# Altium footprint library zynq.PcbLib: 111 footprints (part 4 of 7)
Each footprint in its own frame and in the unit in brackets; x right, y up, seen from the top. Pads: shape width x height; smd on the part's side, far side on the other; paste and mask are expansions set on the pad; w line width, h text height; cw(c..) or ccw(c..) is an arc to the next point about the centre after c.
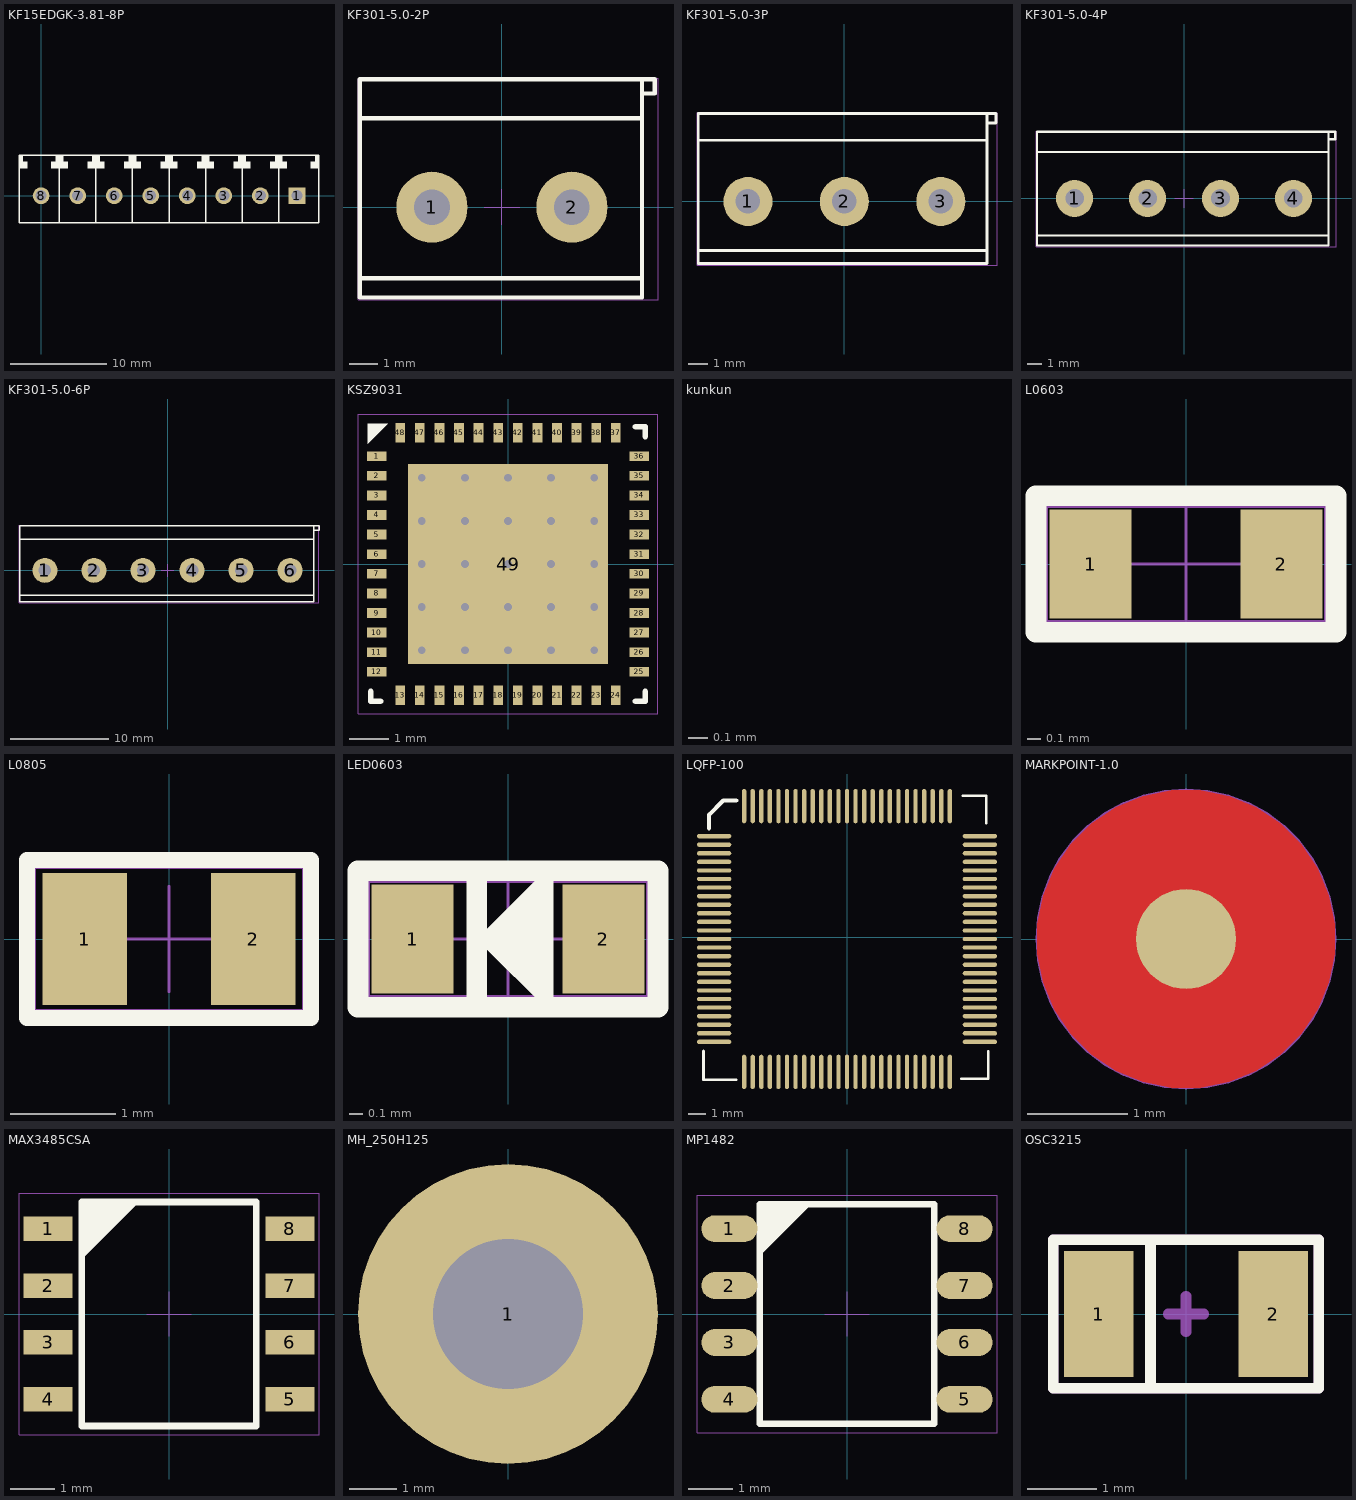
[diagram p3: the footprints below, top view; thin cyan lines are the x and y axes]

## KF15EDGK-3.81-8P [mm]
pads (8):
  rect 1.75x1.75 hole 1.15: 1(26.67,0)
  round 1.75 hole 1.15: 2(22.86,0) 3(19.05,0) 4(15.24,0) 5(11.43,0) 6(7.62,0) 7(3.81,0) 8(0,0)
Top Overlay:
  region: 28.975,4.201 28.975,2.845 28.121,2.845 28.121,3.551 28.596,3.551 28.596,4.201
  region: -2.305,4.201 -2.305,2.845 -1.451,2.845 -1.451,3.551 -1.926,3.551 -1.926,4.201
  region: 24.388,4.201 24.388,3.551 23.917,3.551 23.917,2.845 25.621,2.845 25.621,3.551 25.146,3.551 25.146,4.201
  region: 20.578,4.201 20.578,3.551 20.107,3.551 20.107,2.845 21.811,2.845 21.811,3.551 21.336,3.551 21.336,4.201
  region: 16.768,4.201 16.768,3.551 16.297,3.551 16.297,2.845 18.001,2.845 18.001,3.551 17.526,3.551 17.526,4.201
  region: 12.958,4.201 12.958,3.551 12.487,3.551 12.487,2.845 14.191,2.845 14.191,3.551 13.716,3.551 13.716,4.201
  region: 9.148,4.201 9.148,3.551 8.677,3.551 8.677,2.845 10.381,2.845 10.381,3.551 9.906,3.551 9.906,4.201
  region: 5.338,4.201 5.338,3.551 4.867,3.551 4.867,2.845 6.571,2.845 6.571,3.551 6.096,3.551 6.096,4.201
  region: 1.528,4.201 1.528,3.551 1.057,3.551 1.057,2.845 2.761,2.845 2.761,3.551 2.286,3.551 2.286,4.201
  lines w0.152: 1.907,-2.774 1.907,4.2 ; 5.717,-2.774 5.717,4.2 ; 9.527,-2.774 9.527,4.2 ; 13.337,-2.774 13.337,4.2 ; 17.147,-2.774 17.147,4.2 ; 20.957,-2.774 20.957,4.2 ; 24.767,-2.774 24.767,4.2 ; -2.305,-2.8 28.975,-2.8 28.975,4.2 -2.305,4.2 -2.305,-2.8

## KF301-5.0-2P [mm] "5.0间距螺钉端子"
pads (2):
  round 2.54 hole 1.27: 1(-2.5,0) 2(2.5,0)
Top Overlay:
  lines w0.152: -5.08,-2.54 5,-2.54 ; -5.08,3.175 4.953,3.175 ; 5,4.064 5.461,4.064 5.461,4.572 5,4.572 ; 5,4.572 -5.08,4.572 -5.08,-3.225 5,-3.225 5,4.572
Mechanical 15:
  lines w0.025: -0.635,0 0.635,0 ; 0,-0.635 0,0.635 ; -5.143,-3.315 -5.143,4.61 5.575,4.61 5.575,-3.315 -5.143,-3.315
3D body "KF301-5.0-2.STEP": height 10.16, standoff -1.84, extent -5.033,-3.186 5.467,4.514

## KF301-5.0-3P [mm]
pads (3):
  round 2.54 hole 1.27: 1(-5,0) 2(0,0) 3(5,0)
Top Overlay:
  lines w0.152: -7.58,-2.54 7.406,-2.54 ; -7.58,3.175 7.406,3.175 ; 7.406,4.064 7.867,4.064 7.867,4.572 7.406,4.572 ; 7.406,4.572 7.406,-3.225 -7.58,-3.225 -7.58,4.572 7.406,4.572
Mechanical 15:
  lines w0.025: -0.635,0 0.635,0 ; 0,-0.635 0,0.635 ; -7.644,-3.315 7.914,-3.315 7.914,4.61 -7.644,4.61 -7.644,-3.315
3D body "KF301-5.0-3.STEP": height 10, standoff -2, extent -7.583,-3.128 7.917,4.572

## KF301-5.0-4P [mm]
pads (4):
  round 2.54 hole 1.27: 1(-7.5,0) 2(-2.5,0) 3(2.5,0) 4(7.5,0)
Top Overlay:
  lines w0.152: -10.08,-2.54 9.906,-2.54 ; -10.08,3.175 9.906,3.175 ; 9.906,4.064 10.367,4.064 10.367,4.572 9.906,4.572 ; 9.906,4.572 9.906,-3.225 -10.08,-3.225 -10.08,4.572 9.906,4.572
Mechanical 15:
  lines w0.025: -0.635,0 0.635,0 ; 0,-0.635 0,0.635 ; -10.144,-3.315 10.414,-3.315 10.414,4.61 -10.144,4.61 -10.144,-3.315

## KF301-5.0-6P [mm]
pads (6):
  round 2.54 hole 1.27: 1(-12.5,0) 2(-7.5,0) 3(-2.5,0) 4(2.5,0) 5(7.5,0) 6(12.5,0)
Top Overlay:
  lines w0.152: -15.08,-2.54 14.812,-2.54 ; -15.08,3.175 14.906,3.175 ; 14.906,4.064 15.447,4.064 15.447,4.572 4.906,4.572 -15.08,4.572 -15.08,-3.225 14.906,-3.225 14.906,4.572
Mechanical 15:
  lines w0.025: -0.635,0 0.635,0 ; 0,-0.635 0,0.635 ; -15.144,-3.315 15.414,-3.315 15.414,4.61 -15.144,4.61 -15.144,-3.315

## KSZ9031 [mm] "QFN, 48-Leads, Body 7.00x7.00mm, Pitch 0.50mm, Thermal Pad 5.10x5.10mm, IPC High Density"
height 0.85
pads (49):
  rect 0.5x0.25 smd: 1(-3.35,2.75) 2(-3.35,2.25) 3(-3.35,1.75) 4(-3.35,1.25) 5(-3.35,0.75) 6(-3.35,0.25) 7(-3.35,-0.25) 8(-3.35,-0.75) 9(-3.35,-1.25) 10(-3.35,-1.75) 11(-3.35,-2.25) 12(-3.35,-2.75) 25(3.35,-2.75) 26(3.35,-2.25) 27(3.35,-1.75) 28(3.35,-1.25) 29(3.35,-0.75) 30(3.35,-0.25) 31(3.35,0.25) 32(3.35,0.75) 33(3.35,1.25) 34(3.35,1.75) 35(3.35,2.25) 36(3.35,2.75)
  rect 0.25x0.5 smd: 13(-2.75,-3.35) 14(-2.25,-3.35) 15(-1.75,-3.35) 16(-1.25,-3.35) 17(-0.75,-3.35) 18(-0.25,-3.35) 19(0.25,-3.35) 20(0.75,-3.35) 21(1.25,-3.35) 22(1.75,-3.35) 23(2.25,-3.35) 24(2.75,-3.35) 37(2.75,3.35) 38(2.25,3.35) 39(1.75,3.35) 40(1.25,3.35) 41(0.75,3.35) 42(0.25,3.35) 43(-0.25,3.35) 44(-0.75,3.35) 45(-1.25,3.35) 46(-1.75,3.35) 47(-2.25,3.35) 48(-2.75,3.35)
  rect 5.1x5.1 smd: 49(0,0)
via -2.2,2.2 diameter 0.45 hole 0.2
via -1.1,2.2 diameter 0.45 hole 0.2
via 0,2.2 diameter 0.45 hole 0.2
via 1.1,2.2 diameter 0.45 hole 0.2
via 2.2,2.2 diameter 0.45 hole 0.2
via -2.2,1.1 diameter 0.45 hole 0.2
via -1.1,1.1 diameter 0.45 hole 0.2
via 0,1.1 diameter 0.45 hole 0.2
via 1.1,1.1 diameter 0.45 hole 0.2
via 2.2,1.1 diameter 0.45 hole 0.2
via -2.2,0 diameter 0.45 hole 0.2
via -1.1,0 diameter 0.45 hole 0.2
via 0,0 diameter 0.45 hole 0.2
via 1.1,0 diameter 0.45 hole 0.2
via 2.2,0 diameter 0.45 hole 0.2
via -2.2,-1.1 diameter 0.45 hole 0.2
via -1.1,-1.1 diameter 0.45 hole 0.2
via 0,-1.1 diameter 0.45 hole 0.2
via 1.1,-1.1 diameter 0.45 hole 0.2
via 2.2,-1.1 diameter 0.45 hole 0.2
via -2.2,-2.2 diameter 0.45 hole 0.2
via -1.1,-2.2 diameter 0.45 hole 0.2
via 0,-2.2 diameter 0.45 hole 0.2
via 1.1,-2.2 diameter 0.45 hole 0.2
via 2.2,-2.2 diameter 0.45 hole 0.2
Top Overlay:
  region: -3.062,3.577 -3.577,3.577 -3.577,3.063
  lines w0.152: -3.5,-3.251 -3.5,-3.5 -3.251,-3.5 ; 3.251,-3.5 3.5,-3.5 3.5,-3.251 ; 3.251,3.5 3.5,3.5 3.5,3.251
Mechanical 15:
  lines w0.025: -0.5,0 0.5,0 ; 0,-0.5 0,0.5 ; -3.825,-3.825 -3.825,3.825 3.825,3.825 3.825,-3.825 -3.825,-3.825
3D body "ksz9031.STEP": height 0.88, standoff 0, extent -3.567,-3.57 3.563,3.56

## kunkun [mm]
Top Overlay:
  text "Designed by RUAN DING" at -6.858,0.286 h1.52

## L0603 [mm]
pads (2):
  rect 0.6x0.8 smd: 1(-0.7,0) 2(0.7,0)
Top Overlay:
  lines w0.152: -1.1,-0.5 -1.1,0.5 1.1,0.5 1.1,-0.5 -1.1,-0.5
Mechanical 15:
  lines w0.025: -0.45,0 0.45,0 ; 0,-0.45 0,0.45 ; -1.024,-0.424 -1.024,0.424 1.024,0.424 1.024,-0.424 -1.024,-0.424
3D body "0603-thick5.STEP": height 0.5, standoff 0, extent -0.81,-0.404 0.79,0.405

## L0805 [mm] "C0805"
pads (2):
  rect 0.8x1.25 smd: 1(-0.8,0) 2(0.8,0)
Top Overlay:
  lines w0.152: -1.35,-0.75 -1.35,0.75 1.35,0.75 1.35,-0.75 -1.35,-0.75
Mechanical 15:
  lines w0.025: -0.5,0 0.5,0 ; 0,-0.5 0,0.5 ; -1.275,-0.676 -1.275,0.676 1.275,0.676 1.275,-0.676 -1.275,-0.676
3D body "0805-thickM.STEP": height 1.19, standoff 0, extent -0.989,-0.66 1.011,0.665

## LED0603 [mm] "Chip LED, 2-Leads, Body 1.60x0.80mm, IPC High Density"
height 0.45
pads (2):
  rect 0.6x0.8 smd: 1(-0.7,0) 2(0.7,0)
Top Overlay:
  region: 0.33,0.559 -0.229,0 0.33,-0.559
  lines w0.152: -0.229,-0.5 -0.229,0.5 ; -1.1,-0.5 -1.1,0.5 1.1,0.5 1.1,-0.5 -1.1,-0.5
Mechanical 15:
  lines w0.025: -0.45,0 0.45,0 ; 0,-0.45 0,0.45 ; -1.024,-0.424 1.024,-0.424 1.024,0.424 -1.024,0.424 -1.024,-0.424
3D body "led0603.STEP": height 0.65, standoff 0.01, extent -0.85,-0.394 0.85,0.406

## LQFP-100 [mm] "LQFP-100"
pads (100):
  oval 2x0.25 smd: 1(-7.75,5.899) 2(-7.75,5.399) 3(-7.75,4.899) 4(-7.75,4.399) 5(-7.75,3.899) 6(-7.75,3.399) 7(-7.75,2.899) 8(-7.75,2.399) 9(-7.75,1.899) 10(-7.75,1.399) 11(-7.75,0.899) 12(-7.75,0.399) 13(-7.75,-0.101) 14(-7.75,-0.601) 15(-7.75,-1.101) 16(-7.75,-1.601) 17(-7.75,-2.101) 18(-7.75,-2.601) 19(-7.75,-3.101) 20(-7.75,-3.601) 21(-7.75,-4.101) 22(-7.75,-4.601) 23(-7.75,-5.101) 24(-7.75,-5.601) 25(-7.75,-6.101) 51(7.75,-6.101) 52(7.75,-5.601) 53(7.75,-5.101) 54(7.75,-4.601) 55(7.75,-4.101) 56(7.75,-3.601) 57(7.75,-3.101) 58(7.75,-2.601) 59(7.75,-2.101) 60(7.75,-1.601) 61(7.75,-1.101) 62(7.75,-0.601) 63(7.75,-0.101) 64(7.75,0.399) 65(7.75,0.899) 66(7.75,1.399) 67(7.75,1.899) 68(7.75,2.399) 69(7.75,2.899) 70(7.75,3.399) 71(7.75,3.899) 72(7.75,4.399) 73(7.75,4.899) 74(7.75,5.399) 75(7.75,5.899)
  oval 0.25x2 smd: 26(-6,-7.851) 27(-5.5,-7.851) 28(-5,-7.851) 29(-4.5,-7.851) 30(-4,-7.851) 31(-3.5,-7.851) 32(-3,-7.851) 33(-2.5,-7.851) 34(-2,-7.851) 35(-1.5,-7.851) 36(-1,-7.851) 37(-0.5,-7.851) 38(0,-7.851) 39(0.5,-7.851) 40(1,-7.851) 41(1.5,-7.851) 42(2,-7.851) 43(2.5,-7.851) 44(3,-7.851) 45(3.5,-7.851) 46(4,-7.851) 47(4.5,-7.851) 48(5,-7.851) 49(5.5,-7.851) 50(6,-7.851) 76(6,7.649) 77(5.5,7.649) 78(5,7.649) 79(4.5,7.649) 80(4,7.649) 81(3.5,7.649) 82(3,7.649) 83(2.5,7.649) 84(2,7.649) 85(1.5,7.649) 86(1,7.649) 87(0.5,7.649) 88(0,7.649) 89(-0.5,7.649) 90(-1,7.649) 91(-1.5,7.649) 92(-2,7.649) 93(-2.5,7.649) 94(-3,7.649) 95(-3.5,7.649) 96(-4,7.649) 97(-4.5,7.649) 98(-5,7.649) 99(-5.5,7.649) 100(-6,7.649)
Top Overlay:
  lines w0.152: -8.369,-6.637 -8.369,-8.315 -6.469,-8.315 ; 6.673,-8.247 8.233,-8.247 8.233,-6.664 ; 6.762,8.245 8.121,8.245 8.121,6.645
  lines w0.254: -8.052,6.351 -8.052,7.138 -7.214,7.976 -6.452,7.976

## MARKPOINT-1.0 [mm]
pads (2):
  round 3 on Top Solder: ""(0,0)
  round 1 smd: ""(0,0)
Top Layer:
  pour cut-out: 0,-1.486 -0.146,-1.486 -0.434,-1.429 -0.704,-1.317 -0.948,-1.155 -1.155,-0.948 -1.317,-0.704 -1.429,-0.434 -1.486,-0.146 -1.486,0 -1.486,0.146 -1.429,0.434 -1.317,0.704 -1.155,0.948 -0.948,1.155 -0.704,1.317 -0.434,1.429 -0.146,1.486 0,1.486 0.146,1.486 0.434,1.429 0.704,1.317 0.948,1.155 1.155,0.948 1.317,0.704 1.429,0.434 1.486,0.146 1.486,0 1.486,-0.146 1.429,-0.434 1.317,-0.704 1.155,-0.948 0.948,-1.155 0.704,-1.317 0.434,-1.429 0.146,-1.486
Mechanical 15:
  circle w0.025: c0,0 r1.494

## MAX3485CSA [mm]
height 1.7
pads (8):
  rect 1.1x0.55 smd: 1(-2.7,1.905) 2(-2.7,0.635) 3(-2.7,-0.635) 4(-2.7,-1.905) 5(2.7,-1.905) 6(2.7,-0.635) 7(2.7,0.635) 8(2.7,1.905)
Top Overlay:
  region: -0.635,2.54 -1.905,1.27 -1.95,1.27 -1.95,2.5
  lines w0.152: -1.95,-2.5 -1.95,2.5 1.95,2.5 1.95,-2.5 -1.95,-2.5
Mechanical 15:
  lines w0.025: -0.5,0 0.5,0 ; 0,-0.5 0,0.5 ; -3.35,-2.7 -3.35,2.7 3.35,2.7 3.35,-2.7 -3.35,-2.7
3D body "max3485.STEP": height 1.78, standoff 0, extent -3.128,-2.5 3.128,2.5

## MH_250H125 [mm] "MH_250H125"
pads (1):
  round 6.35 hole 3.175: 1(0,0)
Mechanical 10:
  text "1" at -0.406,0 h0.51

## MP1482 [mm]
height 1.75
pads (8):
  oval 1.25x0.6 smd: 1(-2.625,1.905) 2(-2.625,0.635) 3(-2.625,-0.635) 4(-2.625,-1.905) 5(2.625,-1.905) 6(2.625,-0.635) 7(2.625,0.635) 8(2.625,1.905)
Top Overlay:
  region: -1.936,2.43 -1.916,2.45 -0.8,2.45 -1.95,1.3
  lines w0.152: -1.95,-2.45 -1.95,2.45 1.95,2.45 1.95,-2.45 -1.95,-2.45
Mechanical 15:
  lines w0.025: -0.5,0 0.5,0 ; 0,-0.5 0,0.5 ; -3.35,-2.65 -3.35,2.65 3.35,2.65 3.35,-2.65 -3.35,-2.65
3D body "mp1482.STEP": height 1.74, standoff 0, extent -3.023,-2.428 3.132,2.472

## OSC3215 [mm]
pads (2):
  rect 1x1.8 smd: 1(-1.25,0) 2(1.25,0)
Top Overlay:
  lines w0.152: -0.508,-1.067 -0.508,1.016 ; -1.905,-1.067 1.905,-1.067 1.905,1.067 -1.905,1.067 -1.905,-1.067
Mechanical 15:
  lines w0.152: -0.254,0 0.254,0 ; 0,-0.254 0,0.254 ; -1.905,-1.067 1.905,-1.067 1.905,1.067 -1.905,1.067 -1.905,-1.067